# Altium integrated library Rosenberger HSD.IntLib: 118 symbols (part 2 of 2)
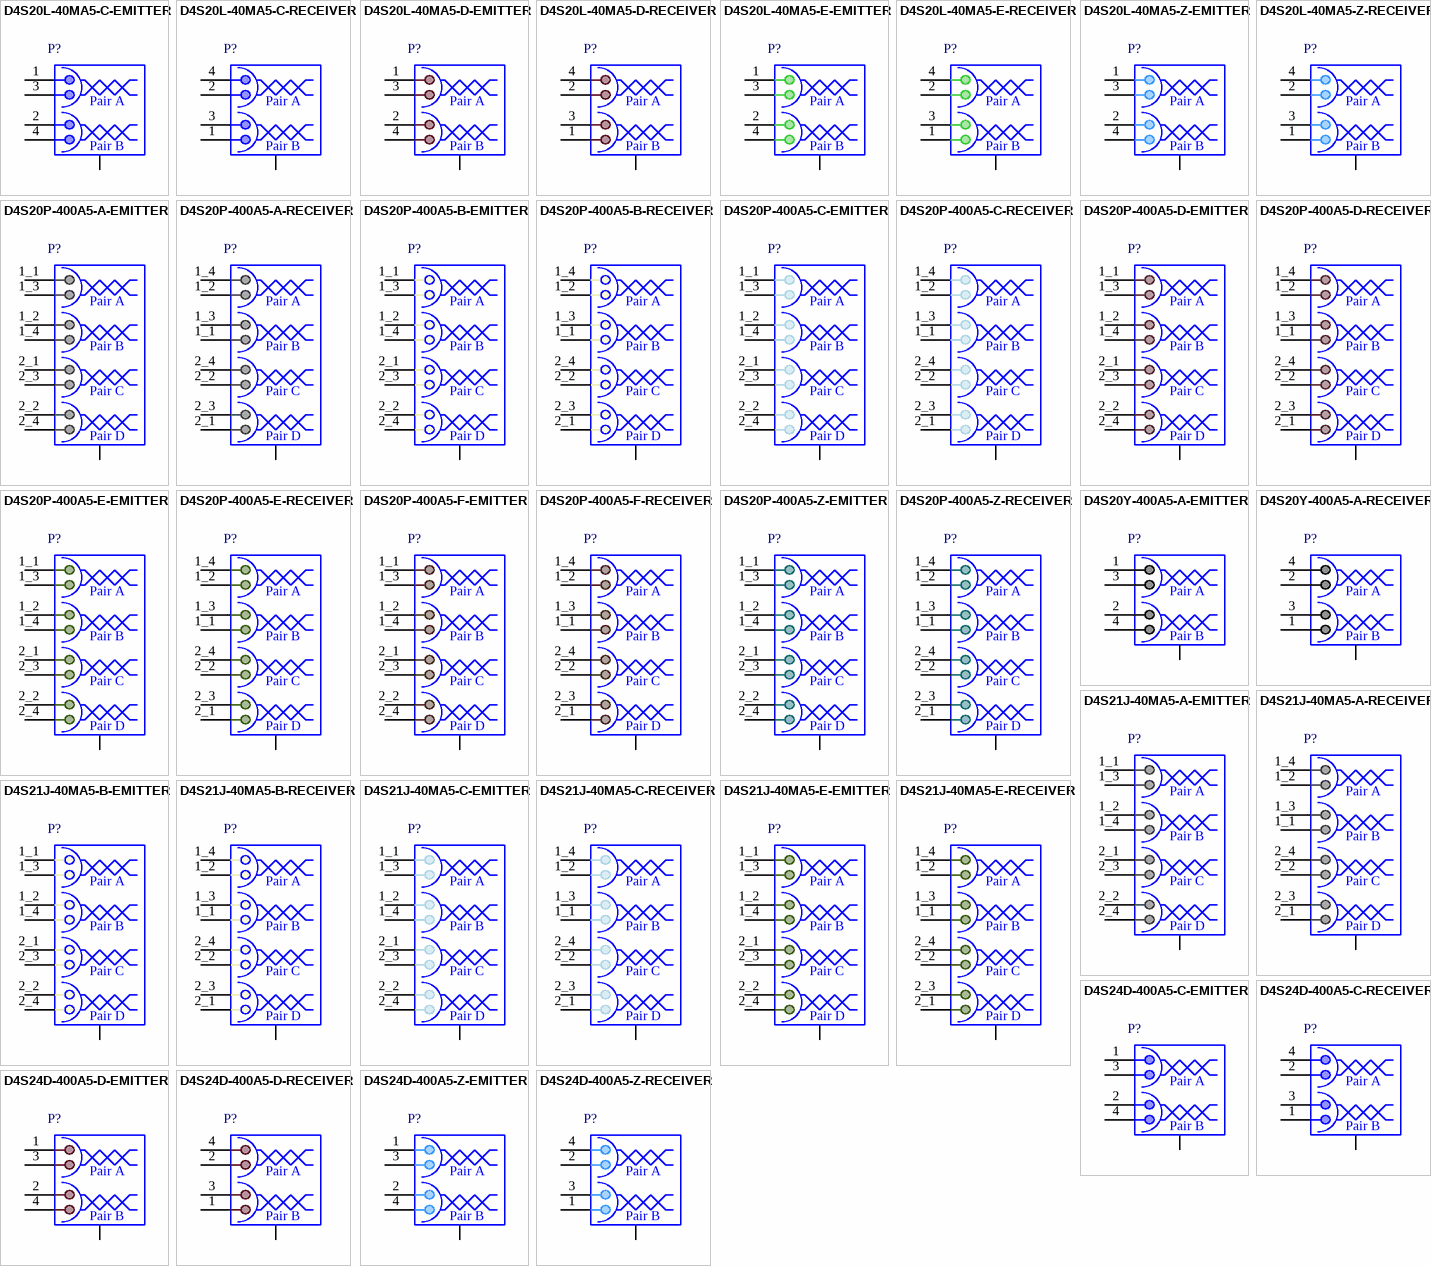
[diagram p3: symbols D4S20L-40MA5-C-EMITTER to D4S24D-400A5-Z-RECEIVER]

## D4S20L-40MA5-E-RECEIVER
designator P?
HSD Right Angle Plug, Edge Mount Pin in Paste, Coding E (Green), Up to 5 GBit/s Per Pair, Receiver Side; PartNumber: D4S20L-40MA5-E-RECEIVER; Design Note 1: Footprint in library is a generic example - only application specific footprint delivers High Performance; Design Note 2: A HSD 1-to-1 connection always needs an Emitter AND Receiver symbol, because the cable has a A->B direction, the pinning must be crossed.; DatasheetVersion: d00; PackageVersion: d00; PackageReference: D4S20L-40MA5-E; PackageDescription: HSD Right Angle Plug, Edge Mount Pin in Paste, 27.3 x 12 x 6.95 mm; Coding: E (Green); Mounting Technology: Pin-in-Paste; ComponentLink1Description: Manufacturer URL; ComponentLink1URL: http://www.rosenberger.de; ComponentLink2Description: Datasheet; ComponentLink2URL: http://rosenberger.de/ok/images/documents/db/D4S20L-40MA5-Y.pdf; ComponentLink3Description: Package Specification; ComponentLink3URL: http://rosenberger.de/ok/images/documents/db/D4S20L-40MA5-Y.pdf; ComponentLink4Description: Series Overview / Design Note; ComponentLink4URL: http://rosenberger.de/ok/images/documents/spez/hsd.pdf; ComponentLink5Description: Webshop / RFQ; ComponentLink5URL: http://www.rosenberger.com/en/contact/sales/
footprint ROS-D4S20L-40MA5-E_V (HSD Right Angle Plug, Edge Mount Pin in Paste, 27.3x12x6.95mm, Rosenberger Recommended)
pins: 1, 2, 3, 4, MH
text: Pair A; Pair B

## D4S20L-40MA5-Z-EMITTER
designator P?
HSD Right Angle Plug, Edge Mount Pin in Paste, Coding Z (Waterblue), Up to 5 GBit/s Per Pair, Emitter Side; PartNumber: D4S20L-40MA5-Z-EMITTER; Design Note 1: Footprint in library is a generic example - only application specific footprint delivers High Performance; Design Note 2: A HSD 1-to-1 connection always needs an Emitter AND Receiver symbol, because the cable has a A->B direction, the pinning must be crossed.; DatasheetVersion: d00; PackageVersion: d00; PackageReference: D4S20L-40MA5-Z; PackageDescription: HSD Right Angle Plug, Edge Mount Pin in Paste, 27.3 x 12 x 6.95 mm; Coding: Z (Waterblue); Mounting Technology: Pin-in-Paste; ComponentLink1Description: Manufacturer URL; ComponentLink1URL: http://www.rosenberger.de; ComponentLink2Description: Datasheet; ComponentLink2URL: http://rosenberger.de/ok/images/documents/db/D4S20L-40MA5-Y.pdf; ComponentLink3Description: Package Specification; ComponentLink3URL: http://rosenberger.de/ok/images/documents/db/D4S20L-40MA5-Y.pdf; ComponentLink4Description: Series Overview / Design Note; ComponentLink4URL: http://rosenberger.de/ok/images/documents/spez/hsd.pdf; ComponentLink5Description: Webshop / RFQ; ComponentLink5URL: http://www.rosenberger.com/en/contact/sales/
footprint ROS-D4S20L-40MA5-Z_V (HSD Right Angle Plug, Edge Mount Pin in Paste, 27.3x12x6.95mm, Rosenberger Recommended)
pins: 1, 2, 3, 4, MH
text: Pair A; Pair B

## D4S20L-40MA5-Z-RECEIVER
designator P?
HSD Right Angle Plug, Edge Mount Pin in Paste, Coding Z (Waterblue), Up to 5 GBit/s Per Pair, Receiver Side; PartNumber: D4S20L-40MA5-Z-RECEIVER; Design Note 1: Footprint in library is a generic example - only application specific footprint delivers High Performance; Design Note 2: A HSD 1-to-1 connection always needs an Emitter AND Receiver symbol, because the cable has a A->B direction, the pinning must be crossed.; DatasheetVersion: d00; PackageVersion: b00; PackageReference: D4S20L-40MA5-Z; PackageDescription: HSD Right Angle Plug, Edge Mount Pin in Paste, 27.3 x 12 x 6.95 mm; Coding: Z (Waterblue); Mounting Technology: Pin-in-Paste; ComponentLink1Description: Manufacturer URL; ComponentLink1URL: http://www.rosenberger.de; ComponentLink2Description: Datasheet; ComponentLink2URL: http://rosenberger.de/ok/images/documents/db/D4S20L-40MA5-Y.pdf; ComponentLink3Description: Package Specification; ComponentLink3URL: http://rosenberger.de/ok/images/documents/db/D4S20L-40MA5-Y.pdf; ComponentLink4Description: Series Overview / Design Note; ComponentLink4URL: http://rosenberger.de/ok/images/documents/spez/hsd.pdf; ComponentLink5Description: Webshop / RFQ; ComponentLink5URL: http://www.rosenberger.com/en/contact/sales/
footprint ROS-D4S20L-40MA5-Z_V (HSD Right Angle Plug, Edge Mount Pin in Paste, 27.3x12x6.95mm, Rosenberger Recommended)
pins: 1, 2, 3, 4, MH
text: Pair A; Pair B

## D4S20P-400A5-A-EMITTER
designator P?
Dual HSD Right Angle Plug, Edge Mount, Coding A+B, Up to 5 GBit/s Per Pair, Emitter Side; PartNumber: D4S20P-400A5-A-EMITTER; Coding: A (A+B Graphite-Black); Design Note 1: Footprint in library is a generic example - only application specific footprint delivers High Performance; Design Note 2: A HSD 1-to-1 connection always needs an Emitter AND Receiver symbol, because the cable has a A->B direction, the pinning must be crossed.; DatasheetVersion: a00; PackageVersion: a00; PackageReference: D4S20P-400A5-A; PackageDescription: Dual HSD Right Angle Plug, Edge Mount, 28.25 x 24.7 x 8.1 mm; Mounting Technology: Through Hole; ComponentLink1Description: Manufacturer URL; ComponentLink1URL: http://www.rosenberger.de; ComponentLink2Description: Datasheet; ComponentLink2URL: http://rosenberger.de/ok/images/documents/db/D4S20P-400A5-Y.pdf; ComponentLink3Description: Package Specification; ComponentLink3URL: http://rosenberger.de/ok/images/documents/db/D4S20P-400A5-Y.pdf; ComponentLink4Description: Series Overview / Design Note; ComponentLink4URL: http://rosenberger.de/ok/images/documents/spez/hsd.pdf; ComponentLink5Description: Webshop / RFQ; ComponentLink5URL: http://www.rosenberger.com/en/contact/sales/
footprint ROS-D4S20P-400A5-A_V (Dual HSD Right Angle Plug, Edge Mount, 28.25x24.7x8.1mm, Rosenberger Recommended)
pins: 1_1, 1_2, 1_3, 1_4, 2_1, 2_2, 2_3, 2_4, MH
text: Pair A; Pair B; Pair C; Pair D

## D4S20P-400A5-A-RECEIVER
designator P?
Dual HSD Right Angle Plug, Edge Mount, Coding A+B, Up to 5 GBit/s Per Pair, Receiver Side; PartNumber: D4S20P-400A5-A-RECEIVER; Coding: A (A+B Graphite-Black); Design Note 1: Footprint in library is a generic example - only application specific footprint delivers High Performance; Design Note 2: A HSD 1-to-1 connection always needs an Emitter AND Receiver symbol, because the cable has a A->B direction, the pinning must be crossed.; DatasheetVersion: a00; PackageVersion: a00; PackageReference: D4S20P-400A5-A; PackageDescription: Dual HSD Right Angle Plug, Edge Mount, 28.25 x 24.7 x 8.1 mm; Mounting Technology: Through Hole; ComponentLink1Description: Manufacturer URL; ComponentLink1URL: http://www.rosenberger.de; ComponentLink2Description: Datasheet; ComponentLink2URL: http://rosenberger.de/ok/images/documents/db/D4S20P-400A5-Y.pdf; ComponentLink3Description: Package Specification; ComponentLink3URL: http://rosenberger.de/ok/images/documents/db/D4S20P-400A5-Y.pdf; ComponentLink4Description: Series Overview / Design Note; ComponentLink4URL: http://rosenberger.de/ok/images/documents/spez/hsd.pdf; ComponentLink5Description: Webshop / RFQ; ComponentLink5URL: http://www.rosenberger.com/en/contact/sales/
footprint ROS-D4S20P-400A5-A_V (Dual HSD Right Angle Plug, Edge Mount, 28.25x24.7x8.1mm, Rosenberger Recommended)
pins: 1_1, 1_2, 1_3, 1_4, 2_1, 2_2, 2_3, 2_4, MH
text: Pair A; Pair B; Pair C; Pair D

## D4S20P-400A5-B-EMITTER
designator P?
Dual HSD Right Angle Plug, Edge Mount, Coding B+A, Up to 5 GBit/s Per Pair, Emitter Side; PartNumber: D4S20P-400A5-B-EMITTER; Coding: B (B+A Natural); Design Note 1: Footprint in library is a generic example - only application specific footprint delivers High Performance; Design Note 2: A HSD 1-to-1 connection always needs an Emitter AND Receiver symbol, because the cable has a A->B direction, the pinning must be crossed.; DatasheetVersion: a00; PackageVersion: a00; PackageReference: D4S20P-400A5-B; PackageDescription: Dual HSD Right Angle Plug, Edge Mount, 28.25 x 24.7 x 8.1 mm; Mounting Technology: Through Hole; ComponentLink1Description: Manufacturer URL; ComponentLink1URL: http://www.rosenberger.de; ComponentLink2Description: Datasheet; ComponentLink2URL: http://rosenberger.de/ok/images/documents/db/D4S20P-400A5-Y.pdf; ComponentLink3Description: Package Specification; ComponentLink3URL: http://rosenberger.de/ok/images/documents/db/D4S20P-400A5-Y.pdf; ComponentLink4Description: Series Overview / Design Note; ComponentLink4URL: http://rosenberger.de/ok/images/documents/spez/hsd.pdf; ComponentLink5Description: Webshop / RFQ; ComponentLink5URL: http://www.rosenberger.com/en/contact/sales/
footprint ROS-D4S20P-400A5-B_V (Dual HSD Right Angle Plug, Edge Mount, 28.25x24.7x8.1mm, Rosenberger Recommended)
pins: 1_1, 1_2, 1_3, 1_4, 2_1, 2_2, 2_3, 2_4, MH
text: Pair A; Pair B; Pair C; Pair D

## D4S20P-400A5-B-RECEIVER
designator P?
Dual HSD Right Angle Plug, Edge Mount, Coding B+A, Up to 5 GBit/s Per Pair, Receiver Side; PartNumber: D4S20P-400A5-B-RECEIVER; Coding: B (B+A Natural); Design Note 1: Footprint in library is a generic example - only application specific footprint delivers High Performance; Design Note 2: A HSD 1-to-1 connection always needs an Emitter AND Receiver symbol, because the cable has a A->B direction, the pinning must be crossed.; DatasheetVersion: a00; PackageVersion: a00; PackageReference: D4S20P-400A5-B; PackageDescription: Dual HSD Right Angle Plug, Edge Mount, 28.25 x 24.7 x 8.1 mm; Mounting Technology: Through Hole; ComponentLink1Description: Manufacturer URL; ComponentLink1URL: http://www.rosenberger.de; ComponentLink2Description: Datasheet; ComponentLink2URL: http://rosenberger.de/ok/images/documents/db/D4S20P-400A5-Y.pdf; ComponentLink3Description: Package Specification; ComponentLink3URL: http://rosenberger.de/ok/images/documents/db/D4S20P-400A5-Y.pdf; ComponentLink4Description: Series Overview / Design Note; ComponentLink4URL: http://rosenberger.de/ok/images/documents/spez/hsd.pdf; ComponentLink5Description: Webshop / RFQ; ComponentLink5URL: http://www.rosenberger.com/en/contact/sales/
footprint ROS-D4S20P-400A5-B_V (Dual HSD Right Angle Plug, Edge Mount, 28.25x24.7x8.1mm, Rosenberger Recommended)
pins: 1_1, 1_2, 1_3, 1_4, 2_1, 2_2, 2_3, 2_4, MH
text: Pair A; Pair B; Pair C; Pair D

## D4S20P-400A5-C-EMITTER
designator P?
Dual HSD Right Angle Plug, Edge Mount, Coding C+D, Up to 5 GBit/s Per Pair, Emitter Side; PartNumber: D4S20P-400A5-C-EMITTER; Coding: C (C+D Light Blue); Design Note 1: Footprint in library is a generic example - only application specific footprint delivers High Performance; Design Note 2: A HSD 1-to-1 connection always needs an Emitter AND Receiver symbol, because the cable has a A->B direction, the pinning must be crossed.; DatasheetVersion: a00; PackageVersion: a00; PackageReference: D4S20P-400A5-C; PackageDescription: Dual HSD Right Angle Plug, Edge Mount, 28.25 x 24.7 x 8.1 mm; Mounting Technology: Through Hole; ComponentLink1Description: Manufacturer URL; ComponentLink1URL: http://www.rosenberger.de; ComponentLink2Description: Datasheet; ComponentLink2URL: http://rosenberger.de/ok/images/documents/db/D4S20P-400A5-Y.pdf; ComponentLink3Description: Package Specification; ComponentLink3URL: http://rosenberger.de/ok/images/documents/db/D4S20P-400A5-Y.pdf; ComponentLink4Description: Series Overview / Design Note; ComponentLink4URL: http://rosenberger.de/ok/images/documents/spez/hsd.pdf; ComponentLink5Description: Webshop / RFQ; ComponentLink5URL: http://www.rosenberger.com/en/contact/sales/
footprint ROS-D4S20P-400A5-C_V (Dual HSD Right Angle Plug, Edge Mount, 28.25x24.7x8.1mm, Rosenberger Recommended)
pins: 1_1, 1_2, 1_3, 1_4, 2_1, 2_2, 2_3, 2_4, MH
text: Pair A; Pair B; Pair C; Pair D

## D4S20P-400A5-C-RECEIVER
designator P?
Dual HSD Right Angle Plug, Edge Mount, Coding C+D, Up to 5 GBit/s Per Pair, Receiver Side; PartNumber: D4S20P-400A5-C-RECEIVER; Coding: C (C+D Light Blue); Design Note 1: Footprint in library is a generic example - only application specific footprint delivers High Performance; Design Note 2: A HSD 1-to-1 connection always needs an Emitter AND Receiver symbol, because the cable has a A->B direction, the pinning must be crossed.; DatasheetVersion: a00; PackageVersion: a00; PackageReference: D4S20P-400A5-C; PackageDescription: Dual HSD Right Angle Plug, Edge Mount, 28.25 x 24.7 x 8.1 mm; Mounting Technology: Through Hole; ComponentLink1Description: Manufacturer URL; ComponentLink1URL: http://www.rosenberger.de; ComponentLink2Description: Datasheet; ComponentLink2URL: http://rosenberger.de/ok/images/documents/db/D4S20P-400A5-Y.pdf; ComponentLink3Description: Package Specification; ComponentLink3URL: http://rosenberger.de/ok/images/documents/db/D4S20P-400A5-Y.pdf; ComponentLink4Description: Series Overview / Design Note; ComponentLink4URL: http://rosenberger.de/ok/images/documents/spez/hsd.pdf; ComponentLink5Description: Webshop / RFQ; ComponentLink5URL: http://www.rosenberger.com/en/contact/sales/
footprint ROS-D4S20P-400A5-C_V (Dual HSD Right Angle Plug, Edge Mount, 28.25x24.7x8.1mm, Rosenberger Recommended)
pins: 1_1, 1_2, 1_3, 1_4, 2_1, 2_2, 2_3, 2_4, MH
text: Pair A; Pair B; Pair C; Pair D

## D4S20P-400A5-D-EMITTER
designator P?
Dual HSD Right Angle Plug, Edge Mount, Coding D+C, Up to 5 GBit/s Per Pair, Emitter Side; PartNumber: D4S20P-400A5-D-EMITTER; Coding: D (D+C Claret Violet); Design Note 1: Footprint in library is a generic example - only application specific footprint delivers High Performance; Design Note 2: A HSD 1-to-1 connection always needs an Emitter AND Receiver symbol, because the cable has a A->B direction, the pinning must be crossed.; DatasheetVersion: a00; PackageVersion: a00; PackageReference: D4S20P-400A5-D; PackageDescription: Dual HSD Right Angle Plug, Edge Mount, 28.25 x 24.7 x 8.1 mm; Mounting Technology: Through Hole; ComponentLink1Description: Manufacturer URL; ComponentLink1URL: http://www.rosenberger.de; ComponentLink2Description: Datasheet; ComponentLink2URL: http://rosenberger.de/ok/images/documents/db/D4S20P-400A5-Y.pdf; ComponentLink3Description: Package Specification; ComponentLink3URL: http://rosenberger.de/ok/images/documents/db/D4S20P-400A5-Y.pdf; ComponentLink4Description: Series Overview / Design Note; ComponentLink4URL: http://rosenberger.de/ok/images/documents/spez/hsd.pdf; ComponentLink5Description: Webshop / RFQ; ComponentLink5URL: http://www.rosenberger.com/en/contact/sales/
footprint ROS-D4S20P-400A5-D_V (Dual HSD Right Angle Plug, Edge Mount, 28.25x24.7x8.1mm, Rosenberger Recommended)
pins: 1_1, 1_2, 1_3, 1_4, 2_1, 2_2, 2_3, 2_4, MH
text: Pair A; Pair B; Pair C; Pair D

## D4S20P-400A5-D-RECEIVER
designator P?
Dual HSD Right Angle Plug, Edge Mount, Coding D+C, Up to 5 GBit/s Per Pair, Receiver Side; PartNumber: D4S20P-400A5-D-RECEIVER; Coding: D (D+C Claret Violet); Design Note 1: Footprint in library is a generic example - only application specific footprint delivers High Performance; Design Note 2: A HSD 1-to-1 connection always needs an Emitter AND Receiver symbol, because the cable has a A->B direction, the pinning must be crossed.; DatasheetVersion: a00; PackageVersion: a00; PackageReference: D4S20P-400A5-D; PackageDescription: Dual HSD Right Angle Plug, Edge Mount, 28.25 x 24.7 x 8.1 mm; Mounting Technology: Through Hole; ComponentLink1Description: Manufacturer URL; ComponentLink1URL: http://www.rosenberger.de; ComponentLink2Description: Datasheet; ComponentLink2URL: http://rosenberger.de/ok/images/documents/db/D4S20P-400A5-Y.pdf; ComponentLink3Description: Package Specification; ComponentLink3URL: http://rosenberger.de/ok/images/documents/db/D4S20P-400A5-Y.pdf; ComponentLink4Description: Series Overview / Design Note; ComponentLink4URL: http://rosenberger.de/ok/images/documents/spez/hsd.pdf; ComponentLink5Description: Webshop / RFQ; ComponentLink5URL: http://www.rosenberger.com/en/contact/sales/
footprint ROS-D4S20P-400A5-D_V (Dual HSD Right Angle Plug, Edge Mount, 28.25x24.7x8.1mm, Rosenberger Recommended)
pins: 1_1, 1_2, 1_3, 1_4, 2_1, 2_2, 2_3, 2_4, MH
text: Pair A; Pair B; Pair C; Pair D

## D4S20P-400A5-E-EMITTER
designator P?
Dual HSD Right Angle Plug, Edge Mount, Coding E+F, Up to 5 GBit/s Per Pair, Emitter Side; PartNumber: D4S20P-400A5-E-EMITTER; Coding: E (E+F May-Green); Design Note 1: Footprint in library is a generic example - only application specific footprint delivers High Performance; Design Note 2: A HSD 1-to-1 connection always needs an Emitter AND Receiver symbol, because the cable has a A->B direction, the pinning must be crossed.; DatasheetVersion: a00; PackageVersion: a00; PackageReference: D4S20P-400A5-E; PackageDescription: Dual HSD Right Angle Plug, Edge Mount, 28.25 x 24.7 x 8.1 mm; Mounting Technology: Through Hole; ComponentLink1Description: Manufacturer URL; ComponentLink1URL: http://www.rosenberger.de; ComponentLink2Description: Datasheet; ComponentLink2URL: http://rosenberger.de/ok/images/documents/db/D4S20P-400A5-Y.pdf; ComponentLink3Description: Package Specification; ComponentLink3URL: http://rosenberger.de/ok/images/documents/db/D4S20P-400A5-Y.pdf; ComponentLink4Description: Series Overview / Design Note; ComponentLink4URL: http://rosenberger.de/ok/images/documents/spez/hsd.pdf; ComponentLink5Description: Webshop / RFQ; ComponentLink5URL: http://www.rosenberger.com/en/contact/sales/
footprint ROS-D4S20P-400A5-E_V (Dual HSD Right Angle Plug, Edge Mount, 28.25x24.7x8.1mm, Rosenberger Recommended)
pins: 1_1, 1_2, 1_3, 1_4, 2_1, 2_2, 2_3, 2_4, MH
text: Pair A; Pair B; Pair C; Pair D

## D4S20P-400A5-E-RECEIVER
designator P?
Dual HSD Right Angle Plug, Edge Mount, Coding E+F, Up to 5 GBit/s Per Pair, Receiver Side; PartNumber: D4S20P-400A5-E-RECEIVER; Coding: E (E+F May-Green); Design Note 1: Footprint in library is a generic example - only application specific footprint delivers High Performance; Design Note 2: A HSD 1-to-1 connection always needs an Emitter AND Receiver symbol, because the cable has a A->B direction, the pinning must be crossed.; DatasheetVersion: a00; PackageVersion: a00; PackageReference: D4S20P-400A5-E; PackageDescription: Dual HSD Right Angle Plug, Edge Mount, 28.25 x 24.7 x 8.1 mm; Mounting Technology: Through Hole; ComponentLink1Description: Manufacturer URL; ComponentLink1URL: http://www.rosenberger.de; ComponentLink2Description: Datasheet; ComponentLink2URL: http://rosenberger.de/ok/images/documents/db/D4S20P-400A5-Y.pdf; ComponentLink3Description: Package Specification; ComponentLink3URL: http://rosenberger.de/ok/images/documents/db/D4S20P-400A5-Y.pdf; ComponentLink4Description: Series Overview / Design Note; ComponentLink4URL: http://rosenberger.de/ok/images/documents/spez/hsd.pdf; ComponentLink5Description: Webshop / RFQ; ComponentLink5URL: http://www.rosenberger.com/en/contact/sales/
footprint ROS-D4S20P-400A5-E_V (Dual HSD Right Angle Plug, Edge Mount, 28.25x24.7x8.1mm, Rosenberger Recommended)
pins: 1_1, 1_2, 1_3, 1_4, 2_1, 2_2, 2_3, 2_4, MH
text: Pair A; Pair B; Pair C; Pair D

## D4S20P-400A5-F-EMITTER
designator P?
Dual HSD Right Angle Plug, Edge Mount, Coding F+E, Up to 5 GBit/s Per Pair, Emitter Side; PartNumber: D4S20P-400A5-F-EMITTER; Coding: F (F+E Nut Brown); Design Note 1: Footprint in library is a generic example - only application specific footprint delivers High Performance; Design Note 2: A HSD 1-to-1 connection always needs an Emitter AND Receiver symbol, because the cable has a A->B direction, the pinning must be crossed.; DatasheetVersion: a00; PackageVersion: a00; PackageReference: D4S20P-400A5-F; PackageDescription: Dual HSD Right Angle Plug, Edge Mount, 28.25 x 24.7 x 8.1 mm; Mounting Technology: Through Hole; ComponentLink1Description: Manufacturer URL; ComponentLink1URL: http://www.rosenberger.de; ComponentLink2Description: Datasheet; ComponentLink2URL: http://rosenberger.de/ok/images/documents/db/D4S20P-400A5-Y.pdf; ComponentLink3Description: Package Specification; ComponentLink3URL: http://rosenberger.de/ok/images/documents/db/D4S20P-400A5-Y.pdf; ComponentLink4Description: Series Overview / Design Note; ComponentLink4URL: http://rosenberger.de/ok/images/documents/spez/hsd.pdf; ComponentLink5Description: Webshop / RFQ; ComponentLink5URL: http://www.rosenberger.com/en/contact/sales/
footprint ROS-D4S20P-400A5-F_V (Dual HSD Right Angle Plug, Edge Mount, 28.25x24.7x8.1mm, Rosenberger Recommended)
pins: 1_1, 1_2, 1_3, 1_4, 2_1, 2_2, 2_3, 2_4, MH
text: Pair A; Pair B; Pair C; Pair D

## D4S20P-400A5-F-RECEIVER
designator P?
Dual HSD Right Angle Plug, Edge Mount, Coding F+E, Up to 5 GBit/s Per Pair, Receiver Side; PartNumber: D4S20P-400A5-F-RECEIVER; Coding: F (F+E Nut Brown); Design Note 1: Footprint in library is a generic example - only application specific footprint delivers High Performance; Design Note 2: A HSD 1-to-1 connection always needs an Emitter AND Receiver symbol, because the cable has a A->B direction, the pinning must be crossed.; DatasheetVersion: a00; PackageVersion: a00; PackageReference: D4S20P-400A5-F; PackageDescription: Dual HSD Right Angle Plug, Edge Mount, 28.25 x 24.7 x 8.1 mm; Mounting Technology: Through Hole; ComponentLink1Description: Manufacturer URL; ComponentLink1URL: http://www.rosenberger.de; ComponentLink2Description: Datasheet; ComponentLink2URL: http://rosenberger.de/ok/images/documents/db/D4S20P-400A5-Y.pdf; ComponentLink3Description: Package Specification; ComponentLink3URL: http://rosenberger.de/ok/images/documents/db/D4S20P-400A5-Y.pdf; ComponentLink4Description: Series Overview / Design Note; ComponentLink4URL: http://rosenberger.de/ok/images/documents/spez/hsd.pdf; ComponentLink5Description: Webshop / RFQ; ComponentLink5URL: http://www.rosenberger.com/en/contact/sales/
footprint ROS-D4S20P-400A5-F_V (Dual HSD Right Angle Plug, Edge Mount, 28.25x24.7x8.1mm, Rosenberger Recommended)
pins: 1_1, 1_2, 1_3, 1_4, 2_1, 2_2, 2_3, 2_4, MH
text: Pair A; Pair B; Pair C; Pair D

## D4S20P-400A5-Z-EMITTER
designator P?
Dual HSD Right Angle Plug, Edge Mount, Coding Z+Z, Up to 5 GBit/s Per Pair, Emitter Side; PartNumber: D4S20P-400A5-Z-EMITTER; Coding: Z (Z+Z Waterblue); Design Note 1: Footprint in library is a generic example - only application specific footprint delivers High Performance; Design Note 2: A HSD 1-to-1 connection always needs an Emitter AND Receiver symbol, because the cable has a A->B direction, the pinning must be crossed.; DatasheetVersion: a00; PackageVersion: a00; PackageReference: D4S20P-400A5-Z; PackageDescription: Dual HSD Right Angle Plug, Edge Mount, 28.25 x 24.7 x 8.1 mm; Mounting Technology: Through Hole; ComponentLink1Description: Manufacturer URL; ComponentLink1URL: http://www.rosenberger.de; ComponentLink2Description: Datasheet; ComponentLink2URL: http://rosenberger.de/ok/images/documents/db/D4S20P-400A5-Y.pdf; ComponentLink3Description: Package Specification; ComponentLink3URL: http://rosenberger.de/ok/images/documents/db/D4S20P-400A5-Y.pdf; ComponentLink4Description: Series Overview / Design Note; ComponentLink4URL: http://rosenberger.de/ok/images/documents/spez/hsd.pdf; ComponentLink5Description: Webshop / RFQ; ComponentLink5URL: http://www.rosenberger.com/en/contact/sales/
footprint ROS-D4S20P-400A5-Z_V (Dual HSD Right Angle Plug, Edge Mount, 28.25x24.7x8.1mm, Rosenberger Recommended)
pins: 1_1, 1_2, 1_3, 1_4, 2_1, 2_2, 2_3, 2_4, MH
text: Pair A; Pair B; Pair C; Pair D

## D4S20P-400A5-Z-RECEIVER
designator P?
Dual HSD Right Angle Plug, Edge Mount, Coding Z+Z, Up to 5 GBit/s Per Pair, Receiver Side; PartNumber: D4S20P-400A5-Z-RECEIVER; Coding: Z (Z+Z Waterblue); Design Note 1: Footprint in library is a generic example - only application specific footprint delivers High Performance; Design Note 2: A HSD 1-to-1 connection always needs an Emitter AND Receiver symbol, because the cable has a A->B direction, the pinning must be crossed.; DatasheetVersion: a00; PackageVersion: a00; PackageReference: D4S20P-400A5-Z; PackageDescription: Dual HSD Right Angle Plug, Edge Mount, 28.25 x 24.7 x 8.1 mm; Mounting Technology: Through Hole; ComponentLink1Description: Manufacturer URL; ComponentLink1URL: http://www.rosenberger.de; ComponentLink2Description: Datasheet; ComponentLink2URL: http://rosenberger.de/ok/images/documents/db/D4S20P-400A5-Y.pdf; ComponentLink3Description: Package Specification; ComponentLink3URL: http://rosenberger.de/ok/images/documents/db/D4S20P-400A5-Y.pdf; ComponentLink4Description: Series Overview / Design Note; ComponentLink4URL: http://rosenberger.de/ok/images/documents/spez/hsd.pdf; ComponentLink5Description: Webshop / RFQ; ComponentLink5URL: http://www.rosenberger.com/en/contact/sales/
footprint ROS-D4S20P-400A5-Z_V (Dual HSD Right Angle Plug, Edge Mount, 28.25x24.7x8.1mm, Rosenberger Recommended)
pins: 1_1, 1_2, 1_3, 1_4, 2_1, 2_2, 2_3, 2_4, MH
text: Pair A; Pair B; Pair C; Pair D

## D4S20Y-400A5-A-EMITTER
designator P?
HSD Right Angle Plug, Edge Mount, Shielded Panel Feedthrough, Coding A, Up to 5 GBit/s Per Pair, Emitter Side; PartNumber: D4S20Y-400A5-A-EMITTER; Coding: A (Black); Design Note 1: Footprint in library is a generic example - only application specific footprint delivers High Performance; Design Note 2: A HSD 1-to-1 connection always needs an Emitter AND Receiver symbol, because the cable has a A->B direction, the pinning must be crossed.; DatasheetVersion: 200; PackageVersion: 200; PackageReference: D4S20Y-400A5-A; PackageDescription: HSD Right Angle Plug, Edge Mount, Shielded Panel Feedthrough, 32.88 x 12 x 9.75 mm; Mounting Technology: Through Hole; ComponentLink1Description: Manufacturer URL; ComponentLink1URL: http://www.rosenberger.de; ComponentLink2Description: Datasheet; ComponentLink2URL: http://rosenberger.de/ok/images/documents/db/D4S20Y-400A5-Y.pdf; ComponentLink3Description: Package Specification; ComponentLink3URL: http://rosenberger.de/ok/images/documents/db/D4S20Y-400A5-Y.pdf; ComponentLink4Description: Series Overview / Design Note; ComponentLink4URL: http://rosenberger.de/ok/images/documents/spez/hsd.pdf; ComponentLink5Description: Webshop / RFQ; ComponentLink5URL: http://www.rosenberger.com/en/contact/sales/
footprint ROS-D4S20Y-400A5-A_V (HSD Right Angle Plug, Edge Mount, Shielded Panel Feedthrough, 32.88x12x9.75mm, Rosenberger Recommended)
pins: 1, 2, 3, 4, MH
text: Pair A; Pair B

## D4S20Y-400A5-A-RECEIVER
designator P?
HSD Right Angle Plug, Edge Mount, Shielded Panel Feedthrough, Coding A, Up to 5 GBit/s Per Pair, Receiver Side; PartNumber: D4S20Y-400A5-A-RECEIVER; Coding: A (Black); Design Note 1: Footprint in library is a generic example - only application specific footprint delivers High Performance; Design Note 2: A HSD 1-to-1 connection always needs an Emitter AND Receiver symbol, because the cable has a A->B direction, the pinning must be crossed.; DatasheetVersion: 200; PackageVersion: 200; PackageReference: D4S20Y-400A5-A; PackageDescription: HSD Right Angle Plug, Edge Mount, Shielded Panel Feedthrough, 32.88 x 12 x 9.75 mm; Mounting Technology: Through Hole; ComponentLink1Description: Manufacturer URL; ComponentLink1URL: http://www.rosenberger.de; ComponentLink2Description: Datasheet; ComponentLink2URL: http://rosenberger.de/ok/images/documents/db/D4S20Y-400A5-Y.pdf; ComponentLink3Description: Package Specification; ComponentLink3URL: http://rosenberger.de/ok/images/documents/db/D4S20Y-400A5-Y.pdf; ComponentLink4Description: Series Overview / Design Note; ComponentLink4URL: http://rosenberger.de/ok/images/documents/spez/hsd.pdf; ComponentLink5Description: Webshop / RFQ; ComponentLink5URL: http://www.rosenberger.com/en/contact/sales/
footprint ROS-D4S20Y-400A5-A_V (HSD Right Angle Plug, Edge Mount, Shielded Panel Feedthrough, 32.88x12x9.75mm, Rosenberger Recommended)
pins: 1, 2, 3, 4, MH
text: Pair A; Pair B

## D4S21J-40MA5-A-EMITTER
designator P?
Dual HSD, Right Angle, Edge Mount Pin in Paste, Coding A+B, Height 3.5mm, Up to 5 GBit/s Per Pair, Emitter Side; PartNumber: D4S21J-40MA5-A-EMITTER; Coding: A (A+B Graphite-Black); Design Note 1: Footprint in library is a generic example - only application specific footprint delivers High Performance; Design Note 2: A HSD 1-to-1 connection always needs an Emitter AND Receiver symbol, because the cable has a A->B direction, the pinning must be crossed.; DatasheetVersion: a00; PackageVersion: a00; PackageReference: D4S21J-40MA5-A; PackageDescription: Dual HSD, Right Angle Plug, Edge Mount Pin in Paste, 28.25 x 24.7 x 7.95 mm; Mounting Technology: Pin-in-Paste; ComponentLink1Description: Manufacturer URL; ComponentLink1URL: http://www.rosenberger.de; ComponentLink2Description: Datasheet; ComponentLink2URL: http://rosenberger.de/ok/images/documents/db/D4S21J-40MA5-Y.pdf; ComponentLink3Description: Package Specification; ComponentLink3URL: http://rosenberger.de/ok/images/documents/db/D4S21J-40MA5-Y.pdf; ComponentLink4Description: Series Overview / Design Note; ComponentLink4URL: http://rosenberger.de/ok/images/documents/spez/hsd.pdf; ComponentLink5Description: Webshop / RFQ; ComponentLink5URL: http://www.rosenberger.com/en/contact/sales/
footprint ROS-D4S21J-40MA5-A_V (Dual HSD, Right Angle Plug, Edge Mount Pin in Paste, 28.25x24.7x7.95mm, Rosenberger Recommended)
pins: 1_1, 1_2, 1_3, 1_4, 2_1, 2_2, 2_3, 2_4, MH
text: Pair A; Pair B; Pair C; Pair D

## D4S21J-40MA5-A-RECEIVER
designator P?
Dual HSD, Right Angle, Edge Mount Pin in Paste, Coding A+B, Height 3.5mm, Up to 5 GBit/s Per Pair, Receiver Side; PartNumber: D4S21J-40MA5-A-RECEIVER; Coding: A (A+B Graphite-Black); Design Note 1: Footprint in library is a generic example - only application specific footprint delivers High Performance; Design Note 2: A HSD 1-to-1 connection always needs an Emitter AND Receiver symbol, because the cable has a A->B direction, the pinning must be crossed.; DatasheetVersion: a00; PackageVersion: a00; PackageReference: D4S21J-40MA5-A; PackageDescription: Dual HSD, Right Angle Plug, Edge Mount Pin in Paste, 28.25 x 24.7 x 7.95 mm; Mounting Technology: Pin-in-Paste; ComponentLink1Description: Manufacturer URL; ComponentLink1URL: http://www.rosenberger.de; ComponentLink2Description: Datasheet; ComponentLink2URL: http://rosenberger.de/ok/images/documents/db/D4S21J-40MA5-Y.pdf; ComponentLink3Description: Package Specification; ComponentLink3URL: http://rosenberger.de/ok/images/documents/db/D4S21J-40MA5-Y.pdf; ComponentLink4Description: Series Overview / Design Note; ComponentLink4URL: http://rosenberger.de/ok/images/documents/spez/hsd.pdf; ComponentLink5Description: Webshop / RFQ; ComponentLink5URL: http://www.rosenberger.com/en/contact/sales/
footprint ROS-D4S21J-40MA5-A_V (Dual HSD, Right Angle Plug, Edge Mount Pin in Paste, 28.25x24.7x7.95mm, Rosenberger Recommended)
pins: 1_1, 1_2, 1_3, 1_4, 2_1, 2_2, 2_3, 2_4, MH
text: Pair A; Pair B; Pair C; Pair D

## D4S21J-40MA5-B-EMITTER
designator P?
Dual HSD, Right Angle, Edge Mount Pin in Paste, Coding B+A, Height 3.5mm, Up to 5 GBit/s Per Pair, Emitter Side; PartNumber: D4S21J-40MA5-B-EMITTER; Coding: B (B+A Natural); Design Note 1: Footprint in library is a generic example - only application specific footprint delivers High Performance; Design Note 2: A HSD 1-to-1 connection always needs an Emitter AND Receiver symbol, because the cable has a A->B direction, the pinning must be crossed.; DatasheetVersion: a00; PackageVersion: a00; PackageReference: D4S21J-40MA5-B; PackageDescription: Dual HSD, Right Angle Plug, Edge Mount Pin in Paste, 28.25 x 24.7 x 7.95 mm; Mounting Technology: Pin-in-Paste; ComponentLink1Description: Manufacturer URL; ComponentLink1URL: http://www.rosenberger.de; ComponentLink2Description: Datasheet; ComponentLink2URL: http://rosenberger.de/ok/images/documents/db/D4S21J-40MA5-Y.pdf; ComponentLink3Description: Package Specification; ComponentLink3URL: http://rosenberger.de/ok/images/documents/db/D4S21J-40MA5-Y.pdf; ComponentLink4Description: Series Overview / Design Note; ComponentLink4URL: http://rosenberger.de/ok/images/documents/spez/hsd.pdf; ComponentLink5Description: Webshop / RFQ; ComponentLink5URL: http://www.rosenberger.com/en/contact/sales/
footprint ROS-D4S21J-40MA5-B_V (Dual HSD, Right Angle Plug, Edge Mount Pin in Paste, 28.25x24.7x7.95mm, Rosenberger Recommended)
pins: 1_1, 1_2, 1_3, 1_4, 2_1, 2_2, 2_3, 2_4, MH
text: Pair A; Pair B; Pair C; Pair D

## D4S21J-40MA5-B-RECEIVER
designator P?
Dual HSD, Right Angle, Edge Mount Pin in Paste, Coding B+A, Height 3.5mm, Up to 5 GBit/s Per Pair, Receiver Side; PartNumber: D4S21J-40MA5-B-RECEIVER; Coding: B (B+A Natural); Design Note 1: Footprint in library is a generic example - only application specific footprint delivers High Performance; Design Note 2: A HSD 1-to-1 connection always needs an Emitter AND Receiver symbol, because the cable has a A->B direction, the pinning must be crossed.; DatasheetVersion: a00; PackageVersion: a00; PackageReference: D4S21J-40MA5-B; PackageDescription: Dual HSD, Right Angle Plug, Edge Mount Pin in Paste, 28.25 x 24.7 x 7.95 mm; Mounting Technology: Pin-in-Paste; ComponentLink1Description: Manufacturer URL; ComponentLink1URL: http://www.rosenberger.de; ComponentLink2Description: Datasheet; ComponentLink2URL: http://rosenberger.de/ok/images/documents/db/D4S21J-40MA5-Y.pdf; ComponentLink3Description: Package Specification; ComponentLink3URL: http://rosenberger.de/ok/images/documents/db/D4S21J-40MA5-Y.pdf; ComponentLink4Description: Series Overview / Design Note; ComponentLink4URL: http://rosenberger.de/ok/images/documents/spez/hsd.pdf; ComponentLink5Description: Webshop / RFQ; ComponentLink5URL: http://www.rosenberger.com/en/contact/sales/
footprint ROS-D4S21J-40MA5-B_V (Dual HSD, Right Angle Plug, Edge Mount Pin in Paste, 28.25x24.7x7.95mm, Rosenberger Recommended)
pins: 1_1, 1_2, 1_3, 1_4, 2_1, 2_2, 2_3, 2_4, MH
text: Pair A; Pair B; Pair C; Pair D

## D4S21J-40MA5-C-EMITTER
designator P?
Dual HSD, Right Angle, Edge Mount Pin in Paste, Coding C+D, Height 3.5mm, Up to 5 GBit/s Per Pair, Emitter Side; PartNumber: D4S21J-40MA5-C-EMITTER; Coding: C (C+D Light Blue); Design Note 1: Footprint in library is a generic example - only application specific footprint delivers High Performance; Design Note 2: A HSD 1-to-1 connection always needs an Emitter AND Receiver symbol, because the cable has a A->B direction, the pinning must be crossed.; DatasheetVersion: a00; PackageVersion: a00; PackageReference: D4S21J-40MA5-C; PackageDescription: Dual HSD, Right Angle Plug, Edge Mount Pin in Paste, 28.25 x 24.7 x 7.95 mm; Mounting Technology: Pin-in-Paste; ComponentLink1Description: Manufacturer URL; ComponentLink1URL: http://www.rosenberger.de; ComponentLink2Description: Datasheet; ComponentLink2URL: http://rosenberger.de/ok/images/documents/db/D4S21J-40MA5-Y.pdf; ComponentLink3Description: Package Specification; ComponentLink3URL: http://rosenberger.de/ok/images/documents/db/D4S21J-40MA5-Y.pdf; ComponentLink4Description: Series Overview / Design Note; ComponentLink4URL: http://rosenberger.de/ok/images/documents/spez/hsd.pdf; ComponentLink5Description: Webshop / RFQ; ComponentLink5URL: http://www.rosenberger.com/en/contact/sales/
footprint ROS-D4S21J-40MA5-C_V (Dual HSD, Right Angle Plug, Edge Mount Pin in Paste, 28.25x24.7x7.95mm, Rosenberger Recommended)
pins: 1_1, 1_2, 1_3, 1_4, 2_1, 2_2, 2_3, 2_4, MH
text: Pair A; Pair B; Pair C; Pair D

## D4S21J-40MA5-C-RECEIVER
designator P?
Dual HSD, Right Angle, Edge Mount Pin in Paste, Coding C+D, Height 3.5mm, Up to 5 GBit/s Per Pair, Receiver Side; PartNumber: D4S21J-40MA5-C-RECEIVER; Coding: C (C+D Light Blue); Design Note 1: Footprint in library is a generic example - only application specific footprint delivers High Performance; Design Note 2: A HSD 1-to-1 connection always needs an Emitter AND Receiver symbol, because the cable has a A->B direction, the pinning must be crossed.; DatasheetVersion: a00; PackageVersion: a00; PackageReference: D4S21J-40MA5-C; PackageDescription: Dual HSD, Right Angle Plug, Edge Mount Pin in Paste, 28.25 x 24.7 x 7.95 mm; Mounting Technology: Pin-in-Paste; ComponentLink1Description: Manufacturer URL; ComponentLink1URL: http://www.rosenberger.de; ComponentLink2Description: Datasheet; ComponentLink2URL: http://rosenberger.de/ok/images/documents/db/D4S21J-40MA5-Y.pdf; ComponentLink3Description: Package Specification; ComponentLink3URL: http://rosenberger.de/ok/images/documents/db/D4S21J-40MA5-Y.pdf; ComponentLink4Description: Series Overview / Design Note; ComponentLink4URL: http://rosenberger.de/ok/images/documents/spez/hsd.pdf; ComponentLink5Description: Webshop / RFQ; ComponentLink5URL: http://www.rosenberger.com/en/contact/sales/
footprint ROS-D4S21J-40MA5-C_V (Dual HSD, Right Angle Plug, Edge Mount Pin in Paste, 28.25x24.7x7.95mm, Rosenberger Recommended)
pins: 1_1, 1_2, 1_3, 1_4, 2_1, 2_2, 2_3, 2_4, MH
text: Pair A; Pair B; Pair C; Pair D

## D4S21J-40MA5-E-EMITTER
designator P?
Dual HSD, Right Angle, Edge Mount Pin in Paste, Coding E+F, Height 3.5mm, Up to 5 GBit/s Per Pair, Emitter Side; PartNumber: D4S21J-40MA5-E-EMITTER; Coding: E (E+F May-Green); Design Note 1: Footprint in library is a generic example - only application specific footprint delivers High Performance; Design Note 2: A HSD 1-to-1 connection always needs an Emitter AND Receiver symbol, because the cable has a A->B direction, the pinning must be crossed.; DatasheetVersion: a00; PackageVersion: a00; PackageReference: D4S21J-40MA5-E; PackageDescription: Dual HSD, Right Angle Plug, Edge Mount Pin in Paste, 28.25 x 24.7 x 7.95 mm; Mounting Technology: Pin-in-Paste; ComponentLink1Description: Manufacturer URL; ComponentLink1URL: http://www.rosenberger.de; ComponentLink2Description: Datasheet; ComponentLink2URL: http://rosenberger.de/ok/images/documents/db/D4S21J-40MA5-Y.pdf; ComponentLink3Description: Package Specification; ComponentLink3URL: http://rosenberger.de/ok/images/documents/db/D4S21J-40MA5-Y.pdf; ComponentLink4Description: Series Overview / Design Note; ComponentLink4URL: http://rosenberger.de/ok/images/documents/spez/hsd.pdf; ComponentLink5Description: Webshop / RFQ; ComponentLink5URL: http://www.rosenberger.com/en/contact/sales/
footprint ROS-D4S21J-40MA5-E_V (Dual HSD, Right Angle Plug, Edge Mount Pin in Paste, 28.25x24.7x7.95mm, Rosenberger Recommended)
pins: 1_1, 1_2, 1_3, 1_4, 2_1, 2_2, 2_3, 2_4, MH
text: Pair A; Pair B; Pair C; Pair D

## D4S21J-40MA5-E-RECEIVER
designator P?
Dual HSD, Right Angle, Edge Mount Pin in Paste, Coding E+F, Height 3.5mm, Up to 5 GBit/s Per Pair, Receiver Side; PartNumber: D4S21J-40MA5-E-RECEIVER; Coding: E (E+F May-Green); Design Note 1: Footprint in library is a generic example - only application specific footprint delivers High Performance; Design Note 2: A HSD 1-to-1 connection always needs an Emitter AND Receiver symbol, because the cable has a A->B direction, the pinning must be crossed.; DatasheetVersion: a00; PackageVersion: a00; PackageReference: D4S21J-40MA5-E; PackageDescription: Dual HSD, Right Angle Plug, Edge Mount Pin in Paste, 28.25 x 24.7 x 7.95 mm; Mounting Technology: Pin-in-Paste; ComponentLink1Description: Manufacturer URL; ComponentLink1URL: http://www.rosenberger.de; ComponentLink2Description: Datasheet; ComponentLink2URL: http://rosenberger.de/ok/images/documents/db/D4S21J-40MA5-Y.pdf; ComponentLink3Description: Package Specification; ComponentLink3URL: http://rosenberger.de/ok/images/documents/db/D4S21J-40MA5-Y.pdf; ComponentLink4Description: Series Overview / Design Note; ComponentLink4URL: http://rosenberger.de/ok/images/documents/spez/hsd.pdf; ComponentLink5Description: Webshop / RFQ; ComponentLink5URL: http://www.rosenberger.com/en/contact/sales/
footprint ROS-D4S21J-40MA5-E_V (Dual HSD, Right Angle Plug, Edge Mount Pin in Paste, 28.25x24.7x7.95mm, Rosenberger Recommended)
pins: 1_1, 1_2, 1_3, 1_4, 2_1, 2_2, 2_3, 2_4, MH
text: Pair A; Pair B; Pair C; Pair D

## D4S24D-400A5-C-EMITTER
designator P?
HSD Right Angle Plug, Edge Mount, Coding C (Blue), Up to 5 GBit/s Per Pair, Emitter Side; PartNumber: D4S24D-400A5-C-EMITTER; Design Note 1: Footprint in library is a generic example - only application specific footprint delivers High Performance; Design Note 2: A HSD 1-to-1 connection always needs an Emitter AND Receiver symbol, because the cable has a A->B direction, the pinning must be crossed.; DatasheetVersion: c00; PackageVersion: c00; PackageReference: D4S24D-400A5-C; PackageDescription: HSD Right Angle Plug, Edge Mount, 34 x 15.4 x 10.6 mm; Coding: C (Blue); Mounting Technology: Through Hole; ComponentLink1Description: Manufacturer URL; ComponentLink1URL: http://www.rosenberger.de; ComponentLink2Description: Datasheet; ComponentLink2URL: http://rosenberger.de/ok/images/documents/db/D4S24D-400A5-Y.pdf; ComponentLink3Description: Package Specification; ComponentLink3URL: http://rosenberger.de/ok/images/documents/db/D4S24D-400A5-Y.pdf; ComponentLink4Description: Series Overview / Design Note; ComponentLink4URL: http://rosenberger.de/ok/images/documents/spez/hsd.pdf; ComponentLink5Description: Webshop / RFQ; ComponentLink5URL: http://www.rosenberger.com/en/contact/sales/
footprint ROS-D4S24D-400A5-C_V (HSD Right Angle Plug, Edge Mount, 34x15.4x10.6mm, Rosenberger Recommended)
pins: 1, 2, 3, 4, MH
text: Pair A; Pair B

## D4S24D-400A5-C-RECEIVER
designator P?
HSD Right Angle Plug, Edge Mount, Coding C (Blue), Up to 5 GBit/s Per Pair, Receiver Side; PartNumber: D4S24D-400A5-C-RECEIVER; Design Note 1: Footprint in library is a generic example - only application specific footprint delivers High Performance; Design Note 2: A HSD 1-to-1 connection always needs an Emitter AND Receiver symbol, because the cable has a A->B direction, the pinning must be crossed.; DatasheetVersion: c00; PackageVersion: c00; PackageReference: D4S24D-400A5-C; PackageDescription: HSD Right Angle Plug, Edge Mount, 34 x 15.4 x 10.6 mm; Coding: C (Blue); Mounting Technology: Through Hole; ComponentLink1Description: Manufacturer URL; ComponentLink1URL: http://www.rosenberger.de; ComponentLink2Description: Datasheet; ComponentLink2URL: http://rosenberger.de/ok/images/documents/db/D4S24D-400A5-Y.pdf; ComponentLink3Description: Package Specification; ComponentLink3URL: http://rosenberger.de/ok/images/documents/db/D4S24D-400A5-Y.pdf; ComponentLink4Description: Series Overview / Design Note; ComponentLink4URL: http://rosenberger.de/ok/images/documents/spez/hsd.pdf; ComponentLink5Description: Webshop / RFQ; ComponentLink5URL: http://www.rosenberger.com/en/contact/sales/
footprint ROS-D4S24D-400A5-C_V (HSD Right Angle Plug, Edge Mount, 34x15.4x10.6mm, Rosenberger Recommended)
pins: 1, 2, 3, 4, MH
text: Pair A; Pair B

## D4S24D-400A5-D-EMITTER
designator P?
HSD Right Angle Plug, Edge Mount, Coding D (Bordeaux), Up to 5 GBit/s Per Pair, Emitter Side; PartNumber: D4S24D-400A5-D-EMITTER; Design Note 1: Footprint in library is a generic example - only application specific footprint delivers High Performance; Design Note 2: A HSD 1-to-1 connection always needs an Emitter AND Receiver symbol, because the cable has a A->B direction, the pinning must be crossed.; DatasheetVersion: c00; PackageVersion: c00; PackageReference: D4S24D-400A5-D; PackageDescription: HSD Right Angle Plug, Edge Mount, 34 x 15.4 x 10.6 mm; Coding: D (Bordeaux); Mounting Technology: Through Hole; ComponentLink1Description: Manufacturer URL; ComponentLink1URL: http://www.rosenberger.de; ComponentLink2Description: Datasheet; ComponentLink2URL: http://rosenberger.de/ok/images/documents/db/D4S24D-400A5-Y.pdf; ComponentLink3Description: Package Specification; ComponentLink3URL: http://rosenberger.de/ok/images/documents/db/D4S24D-400A5-Y.pdf; ComponentLink4Description: Series Overview / Design Note; ComponentLink4URL: http://rosenberger.de/ok/images/documents/spez/hsd.pdf; ComponentLink5Description: Webshop / RFQ; ComponentLink5URL: http://www.rosenberger.com/en/contact/sales/
footprint ROS-D4S24D-400A5-D_V (HSD Right Angle Plug, Edge Mount, 34x15.4x10.6mm, Rosenberger Recommended)
pins: 1, 2, 3, 4, MH
text: Pair A; Pair B

## D4S24D-400A5-D-RECEIVER
designator P?
HSD Right Angle Plug, Edge Mount, Coding D (Bordeaux), Up to 5 GBit/s Per Pair, Receiver Side; PartNumber: D4S24D-400A5-D-RECEIVER; Design Note 1: Footprint in library is a generic example - only application specific footprint delivers High Performance; Design Note 2: A HSD 1-to-1 connection always needs an Emitter AND Receiver symbol, because the cable has a A->B direction, the pinning must be crossed.; DatasheetVersion: c00; PackageVersion: c00; PackageReference: D4S24D-400A5-D; PackageDescription: HSD Right Angle Plug, Edge Mount, 34 x 15.4 x 10.6 mm; Coding: D (Bordeaux); Mounting Technology: Through Hole; ComponentLink1Description: Manufacturer URL; ComponentLink1URL: http://www.rosenberger.de; ComponentLink2Description: Datasheet; ComponentLink2URL: http://rosenberger.de/ok/images/documents/db/D4S24D-400A5-Y.pdf; ComponentLink3Description: Package Specification; ComponentLink3URL: http://rosenberger.de/ok/images/documents/db/D4S24D-400A5-Y.pdf; ComponentLink4Description: Series Overview / Design Note; ComponentLink4URL: http://rosenberger.de/ok/images/documents/spez/hsd.pdf; ComponentLink5Description: Webshop / RFQ; ComponentLink5URL: http://www.rosenberger.com/en/contact/sales/
footprint ROS-D4S24D-400A5-D_V (HSD Right Angle Plug, Edge Mount, 34x15.4x10.6mm, Rosenberger Recommended)
pins: 1, 2, 3, 4, MH
text: Pair A; Pair B

## D4S24D-400A5-Z-EMITTER
designator P?
HSD Right Angle Plug, Edge Mount, Coding Z (Waterblue), Up to 5 GBit/s Per Pair, Emitter Side; PartNumber: D4S24D-400A5-Z-EMITTER; Design Note 1: Footprint in library is a generic example - only application specific footprint delivers High Performance; Design Note 2: A HSD 1-to-1 connection always needs an Emitter AND Receiver symbol, because the cable has a A->B direction, the pinning must be crossed.; DatasheetVersion: c00; PackageVersion: c00; PackageReference: D4S24D-400A5-Z; PackageDescription: HSD Right Angle Plug, Edge Mount, 34 x 15.4 x 10.6 mm; Coding: Z (Waterblue); Mounting Technology: Through Hole; ComponentLink1Description: Manufacturer URL; ComponentLink1URL: http://www.rosenberger.de; ComponentLink2Description: Datasheet; ComponentLink2URL: http://rosenberger.de/ok/images/documents/db/D4S24D-400A5-Y.pdf; ComponentLink3Description: Package Specification; ComponentLink3URL: http://rosenberger.de/ok/images/documents/db/D4S24D-400A5-Y.pdf; ComponentLink4Description: Series Overview / Design Note; ComponentLink4URL: http://rosenberger.de/ok/images/documents/spez/hsd.pdf; ComponentLink5Description: Webshop / RFQ; ComponentLink5URL: http://www.rosenberger.com/en/contact/sales/
footprint ROS-D4S24D-400A5-Z_V (HSD Right Angle Plug, Edge Mount, 34x15.4x10.6mm, Rosenberger Recommended)
pins: 1, 2, 3, 4, MH
text: Pair A; Pair B

## D4S24D-400A5-Z-RECEIVER
designator P?
HSD Right Angle Plug, Edge Mount, Coding Z (Waterblue), Up to 5 GBit/s Per Pair, Receiver Side; PartNumber: D4S24D-400A5-Z-RECEIVER; Design Note 1: Footprint in library is a generic example - only application specific footprint delivers High Performance; Design Note 2: A HSD 1-to-1 connection always needs an Emitter AND Receiver symbol, because the cable has a A->B direction, the pinning must be crossed.; DatasheetVersion: c00; PackageVersion: c00; PackageReference: D4S24D-400A5-Z; PackageDescription: HSD Right Angle Plug, Edge Mount, 34 x 15.4 x 10.6 mm; Coding: Z (Waterblue); Mounting Technology: Through Hole; ComponentLink1Description: Manufacturer URL; ComponentLink1URL: http://www.rosenberger.de; ComponentLink2Description: Datasheet; ComponentLink2URL: http://rosenberger.de/ok/images/documents/db/D4S24D-400A5-Y.pdf; ComponentLink3Description: Package Specification; ComponentLink3URL: http://rosenberger.de/ok/images/documents/db/D4S24D-400A5-Y.pdf; ComponentLink4Description: Series Overview / Design Note; ComponentLink4URL: http://rosenberger.de/ok/images/documents/spez/hsd.pdf; ComponentLink5Description: Webshop / RFQ; ComponentLink5URL: http://www.rosenberger.com/en/contact/sales/
footprint ROS-D4S24D-400A5-Z_V (HSD Right Angle Plug, Edge Mount, 34x15.4x10.6mm, Rosenberger Recommended)
pins: 1, 2, 3, 4, MH
text: Pair A; Pair B